# Altium schematic symbol library TI - ADC.SchLib: 2197 symbols (part 7 of 130) (continued)
## ADS42B49IRGCT (continued)

## ADS42JB49IRGCR
designator U?
Dual 14-Bit, 250 MSPS ADC, -40 to 85 degC, 64-pin QFN (RGC64), Green (RoHS & no Sb/Br); Manufacturer: Texas Instruments; PartNumber: ADS42JB49IRGCR; # Input Channels: 2; Analog Voltage AV/DD(Max)(V): 3.45; Analog Voltage AV/DD(Min)(V): 3.15; Architecture: Pipeline; Digital Supply(Max)(V): 1.9; Digital Supply(Min)(V): 1.7; Interface: JEDEC 204B; Resolution(Bits): 14; Sample Rate(max)(SPS): 250M; SFDR(dB): 89; SNR(dB): 71.9; SubFamily: High Speed ADC (>10MSPS); DatasheetVersion: SLAS900A; PackageVersion: 4204106/F, 11/2011; PackageReference: RGC64-7400X7400TP; PackageDescription: 64-Pin Plastic Quad Flatpack No-Lead, Body 9 x 9 mm, Pitch 0.5 mm; Supplier 1: Digi-Key; Supplier Part Number 1: ADS1110A1IDBVR-ND; Supplier 2: Mouser; Supplier Part Number 2: 595-ADS1110A1IDBVR; Mounting Technology: Surface Mount; ComponentLink1Description: Manufacturer URL; ComponentLink1URL: http://www.ti.com/; ComponentLink2Description: Datasheet; ComponentLink2URL: http://www.ti.com/lit/ds/symlink/ads42jb49.pdf; ComponentLink3Description: Package Specification; ComponentLink3URL: http://www.ti.com/litv/pdf/mpqf125e
footprint TI-RGC64-7400X7400TP_V (QFN, 64-Leads, Body 9x9mm, Pitch 0.5mm, Thermal Pad 7.4x7.4mm, TI Recommended)
part A pins: 13 INBP (in) "Differential analog input for channel B", 14 INBM (in) "Differential analog input for channel B", 35 INAM (in) "Differential analog input for channel A", 36 INAP (in) "Differential analog input for channel A", 51 DA1M (out) "JESD204B Serial data output for channel A", 52 DA1P (out) "JESD204B Serial data output for channel A", 53 DA0M (out) "JESD204B Serial data output for channel A", 54 DA0P (out) "JESD204B Serial data output for channel A", 56 DB0P (out) "JESD204B Serial data output for channel B", 57 DB0M (out) "JESD204B Serial data output for channel B", 58 DB1P (out) "JESD204B Serial data output for channel B", 59 DB1M (out) "JESD204B Serial data output for channel B", 61 OVRA (out) "Overrange indication channel A", 62 OVRB (out) "Overrange indication channel B"
part B pins: 4 MODE (in) "Connect to GND", 5 STBY (in) "Standby. Active high with internal pulldown resistor", 6 PDN_GBL (in) "Global power down. Active high with internal pulldown resistor", 8 SYNCP (in) "Synchronization input for JESD204B port", 9 SYNCM (in) "Synchronization input for JESD204B port", 10 CTRL2 (in) "Power down control", 21 VCM (out) "Common mode voltage for analog inputs, 1.9V", 24 CLKINM (in) "Differential clock input for ADC", 25 CLKINP (in) "Differential clock input for ADC", 29 SYSREFP (in) "External sync input", 30 SYSREFM (in) "External sync input", 39 CTRL1 (in) "Power down control", 41 SEN (in) "Serial interface enable", 42 SDATA (in) "Serial interface data input.", 43 SCLK (in) "Serial interface clock input", 44 RESET (in) "Hardware reset. Active high. This pin has an internal 150kO pull-down resistor.", 45 SDOUT (hiz) "Serial interface data output"
part C pins: 1 DGND (power) "Digital ground", 2 DRVDD (power) "Digital 1.8V power supply", 3 DGND (power) "Digital ground", 7 DRVDD (power) "Digital 1.8V power supply", 11 AVDD (power) "Analog 1.8V power supply", 12 AGND (power) "Analog ground", 15 AGND (power) "Analog ground", 16 AVDD (power) "Analog 1.8V power supply", 17 AVDD3V (power) "Analog 3.3V for analog buffer", 18 AVDD (power) "Analog 1.8V power supply", 19 AGND (power) "Analog ground", 20 AGND (power) "Analog ground", 22 AVDD (power) "Analog 1.8V power supply", 23 AGND (power) "Analog ground", 26 AGND (power) "Analog ground", 27 AVDD (power) "Analog 1.8V power supply", 28 AGND (power) "Analog ground", 31 AVDD (power) "Analog 1.8V power supply", 32 AVDD3V (power) "Analog 3.3V for analog buffer", 33 AVDD (power) "Analog 1.8V power supply", 34 AGND (power) "Analog ground", 37 AGND (power) "Analog ground", 38 AVDD (power) "Analog 1.8V power supply", 40 AVDD (power) "Analog 1.8V power supply", 46 DGND (power) "Digital ground", 47 DRVDD (power) "Digital 1.8V power supply", 48 DGND (power) "Digital ground", 49 DRVDD (power) "Digital 1.8V power supply", 50 DGND (power) "Digital ground", 55 IOVDD (power) "Digital 1.8V power supply for the JESD204B transmitter", 60 DRVDD (power) "Digital 1.8V power supply", 63 DGND (power) "Digital ground", 64 DRVDD (power) "Digital 1.8V power supply", 65 EP (power)

## ADS42JB49IRGCT
designator U?
Dual 14-Bit, 250 MSPS ADC, -40 to 85 degC, 64-pin QFN (RGC64), Green (RoHS & no Sb/Br); Manufacturer: Texas Instruments; PartNumber: ADS42JB49IRGCT; # Input Channels: 2; Analog Voltage AV/DD(Max)(V): 3.45; Analog Voltage AV/DD(Min)(V): 3.15; Architecture: Pipeline; Digital Supply(Max)(V): 1.9; Digital Supply(Min)(V): 1.7; Interface: JEDEC 204B; Resolution(Bits): 14; Sample Rate(max)(SPS): 250M; SFDR(dB): 89; SNR(dB): 71.9; SubFamily: High Speed ADC (>10MSPS); DatasheetVersion: SLAS900A; PackageVersion: 4204106/F, 11/2011; PackageReference: RGC64-7400X7400TP; PackageDescription: 64-Pin Plastic Quad Flatpack No-Lead, Body 9 x 9 mm, Pitch 0.5 mm; Supplier 1: Digi-Key; Supplier Part Number 1: ADS1110A1IDBVRG4-ND; Supplier 2: Mouser; Supplier Part Number 2: 595-ADS1110A1IDBVRG4; Mounting Technology: Surface Mount; ComponentLink1Description: Manufacturer URL; ComponentLink1URL: http://www.ti.com/; ComponentLink2Description: Datasheet; ComponentLink2URL: http://www.ti.com/lit/ds/symlink/ads42jb49.pdf; ComponentLink3Description: Package Specification; ComponentLink3URL: http://www.ti.com/litv/pdf/mpqf125e
footprint TI-RGC64-7400X7400TP_V (QFN, 64-Leads, Body 9x9mm, Pitch 0.5mm, Thermal Pad 7.4x7.4mm, TI Recommended)
part A pins: 13 INBP (in) "Differential analog input for channel B", 14 INBM (in) "Differential analog input for channel B", 35 INAM (in) "Differential analog input for channel A", 36 INAP (in) "Differential analog input for channel A", 51 DA1M (out) "JESD204B Serial data output for channel A", 52 DA1P (out) "JESD204B Serial data output for channel A", 53 DA0M (out) "JESD204B Serial data output for channel A", 54 DA0P (out) "JESD204B Serial data output for channel A", 56 DB0P (out) "JESD204B Serial data output for channel B", 57 DB0M (out) "JESD204B Serial data output for channel B", 58 DB1P (out) "JESD204B Serial data output for channel B", 59 DB1M (out) "JESD204B Serial data output for channel B", 61 OVRA (out) "Overrange indication channel A", 62 OVRB (out) "Overrange indication channel B"
part B pins: 4 MODE (in) "Connect to GND", 5 STBY (in) "Standby. Active high with internal pulldown resistor", 6 PDN_GBL (in) "Global power down. Active high with internal pulldown resistor", 8 SYNCP (in) "Synchronization input for JESD204B port", 9 SYNCM (in) "Synchronization input for JESD204B port", 10 CTRL2 (in) "Power down control", 21 VCM (out) "Common mode voltage for analog inputs, 1.9V", 24 CLKINM (in) "Differential clock input for ADC", 25 CLKINP (in) "Differential clock input for ADC", 29 SYSREFP (in) "External sync input", 30 SYSREFM (in) "External sync input", 39 CTRL1 (in) "Power down control", 41 SEN (in) "Serial interface enable", 42 SDATA (in) "Serial interface data input.", 43 SCLK (in) "Serial interface clock input", 44 RESET (in) "Hardware reset. Active high. This pin has an internal 150kO pull-down resistor.", 45 SDOUT (hiz) "Serial interface data output"
part C pins: 1 DGND (power) "Digital ground", 2 DRVDD (power) "Digital 1.8V power supply", 3 DGND (power) "Digital ground", 7 DRVDD (power) "Digital 1.8V power supply", 11 AVDD (power) "Analog 1.8V power supply", 12 AGND (power) "Analog ground", 15 AGND (power) "Analog ground", 16 AVDD (power) "Analog 1.8V power supply", 17 AVDD3V (power) "Analog 3.3V for analog buffer", 18 AVDD (power) "Analog 1.8V power supply", 19 AGND (power) "Analog ground", 20 AGND (power) "Analog ground", 22 AVDD (power) "Analog 1.8V power supply", 23 AGND (power) "Analog ground", 26 AGND (power) "Analog ground", 27 AVDD (power) "Analog 1.8V power supply", 28 AGND (power) "Analog ground", 31 AVDD (power) "Analog 1.8V power supply", 32 AVDD3V (power) "Analog 3.3V for analog buffer", 33 AVDD (power) "Analog 1.8V power supply", 34 AGND (power) "Analog ground", 37 AGND (power) "Analog ground", 38 AVDD (power) "Analog 1.8V power supply", 40 AVDD (power) "Analog 1.8V power supply", 46 DGND (power) "Digital ground", 47 DRVDD (power) "Digital 1.8V power supply", 48 DGND (power) "Digital ground", 49 DRVDD (power) "Digital 1.8V power supply", 50 DGND (power) "Digital ground", 55 IOVDD (power) "Digital 1.8V power supply for the JESD204B transmitter", 60 DRVDD (power) "Digital 1.8V power supply", 63 DGND (power) "Digital ground", 64 DRVDD (power) "Digital 1.8V power supply", 65 EP (power)

## ADS42JB69IRGC25
designator U?
Dual 16-Bit, 250 MSPS ADC, -40 to 85 degC, 64-pin QFN (RGC64), Green (RoHS & no Sb/Br); Manufacturer: Texas Instruments; PartNumber: ADS42JB69IRGC25; # Input Channels: 2; Analog Voltage AV/DD(Max)(V): 3.45; Analog Voltage AV/DD(Min)(V): 3.15; Architecture: Pipeline; Digital Supply(Max)(V): 1.9; Digital Supply(Min)(V): 1.7; Interface: JEDEC 204B; Resolution(Bits): 16; Sample Rate(max)(SPS): 250M; SFDR(dB): 89; SNR(dB): 73.3; SubFamily: High Speed ADC (>10MSPS); DatasheetVersion: SLAS900A; PackageVersion: 4204106/F, 11/2011; PackageReference: RGC64-7400X7400TP; PackageDescription: 64-Pin Plastic Quad Flatpack No-Lead, Body 9 x 9 mm, Pitch 0.5 mm; Supplier 1: Digi-Key; Supplier Part Number 1: 296-14462-2-ND; Supplier 2: Digi-Key; Supplier Part Number 2: 296-14462-1-ND; Supplier 3: Digi-Key; Supplier Part Number 3: 296-14462-6-ND; Supplier 4: Newark; Supplier Part Number 4: 61H4890; Supplier 5: Mouser; Supplier Part Number 5: 595-ADS1110A1IDBVT; Eco-Plan: Green (RoHS & no Sb/Br); Mounting Technology: Surface Mount; ComponentLink1Description: Manufacturer URL; ComponentLink1URL: http://www.ti.com/; ComponentLink2Description: Datasheet; ComponentLink2URL: http://www.ti.com/lit/ds/symlink/ads42jb69.pdf; ComponentLink3Description: Package Specification; ComponentLink3URL: http://www.ti.com/litv/pdf/mpqf125e
footprint TI-RGC64-7400X7400TP_V (QFN, 64-Leads, Body 9x9mm, Pitch 0.5mm, Thermal Pad 7.4x7.4mm, TI Recommended)
part A pins: 13 INBP (in) "Differential analog input for channel B", 14 INBM (in) "Differential analog input for channel B", 35 INAM (in) "Differential analog input for channel A", 36 INAP (in) "Differential analog input for channel A", 51 DA1M (out) "JESD204B Serial data output for channel A", 52 DA1P (out) "JESD204B Serial data output for channel A", 53 DA0M (out) "JESD204B Serial data output for channel A", 54 DA0P (out) "JESD204B Serial data output for channel A", 56 DB0P (out) "JESD204B Serial data output for channel B", 57 DB0M (out) "JESD204B Serial data output for channel B", 58 DB1P (out) "JESD204B Serial data output for channel B", 59 DB1M (out) "JESD204B Serial data output for channel B", 61 OVRA (out) "Overrange indication channel A", 62 OVRB (out) "Overrange indication channel B"
part B pins: 4 MODE (in) "Connect to GND", 5 STBY (in) "Standby. Active high with internal pulldown resistor", 6 PDN_GBL (in) "Global power down. Active high with internal pulldown resistor", 8 SYNCP (in) "Synchronization input for JESD204B port", 9 SYNCM (in) "Synchronization input for JESD204B port", 10 CTRL2 (in) "Power down control", 21 VCM (out) "Common mode voltage for analog inputs, 1.9V", 24 CLKINM (in) "Differential clock input for ADC", 25 CLKINP (in) "Differential clock input for ADC", 29 SYSREFP (in) "External sync input", 30 SYSREFM (in) "External sync input", 39 CTRL1 (in) "Power down control", 41 SEN (in) "Serial interface enable", 42 SDATA (in) "Serial interface data input.", 43 SCLK (in) "Serial interface clock input", 44 RESET (in) "Hardware reset. Active high. This pin has an internal 150kO pull-down resistor.", 45 SDOUT (hiz) "Serial interface data output"
part C pins: 1 DGND (power) "Digital ground", 2 DRVDD (power) "Digital 1.8V power supply", 3 DGND (power) "Digital ground", 7 DRVDD (power) "Digital 1.8V power supply", 11 AVDD (power) "Analog 1.8V power supply", 12 AGND (power) "Analog ground", 15 AGND (power) "Analog ground", 16 AVDD (power) "Analog 1.8V power supply", 17 AVDD3V (power) "Analog 3.3V for analog buffer", 18 AVDD (power) "Analog 1.8V power supply", 19 AGND (power) "Analog ground", 20 AGND (power) "Analog ground", 22 AVDD (power) "Analog 1.8V power supply", 23 AGND (power) "Analog ground", 26 AGND (power) "Analog ground", 27 AVDD (power) "Analog 1.8V power supply", 28 AGND (power) "Analog ground", 31 AVDD (power) "Analog 1.8V power supply", 32 AVDD3V (power) "Analog 3.3V for analog buffer", 33 AVDD (power) "Analog 1.8V power supply", 34 AGND (power) "Analog ground", 37 AGND (power) "Analog ground", 38 AVDD (power) "Analog 1.8V power supply", 40 AVDD (power) "Analog 1.8V power supply", 46 DGND (power) "Digital ground", 47 DRVDD (power) "Digital 1.8V power supply", 48 DGND (power) "Digital ground", 49 DRVDD (power) "Digital 1.8V power supply", 50 DGND (power) "Digital ground", 55 IOVDD (power) "Digital 1.8V power supply for the JESD204B transmitter", 60 DRVDD (power) "Digital 1.8V power supply", 63 DGND (power) "Digital ground", 64 DRVDD (power) "Digital 1.8V power supply", 65 EP (power)

## ADS42JB69IRGCR
designator U?
Dual 16-Bit, 250 MSPS ADC, -40 to 85 degC, 64-pin QFN (RGC64), Green (RoHS & no Sb/Br); Manufacturer: Texas Instruments; PartNumber: ADS42JB69IRGCR; # Input Channels: 2; Analog Voltage AV/DD(Max)(V): 3.45; Analog Voltage AV/DD(Min)(V): 3.15; Architecture: Pipeline; Digital Supply(Max)(V): 1.9; Digital Supply(Min)(V): 1.7; Interface: JEDEC 204B; Resolution(Bits): 16; Sample Rate(max)(SPS): 250M; SFDR(dB): 89; SNR(dB): 73.3; SubFamily: High Speed ADC (>10MSPS); DatasheetVersion: SLAS900A; PackageVersion: 4204106/F, 11/2011; PackageReference: RGC64-7400X7400TP; PackageDescription: 64-Pin Plastic Quad Flatpack No-Lead, Body 9 x 9 mm, Pitch 0.5 mm; Supplier 1: Digi-Key; Supplier Part Number 1: ADS1110A1IDBVTG4-ND; Supplier 2: Mouser; Supplier Part Number 2: 595-ADS1110A1IDBVTG4; Eco-Plan: Green (RoHS & no Sb/Br); Mounting Technology: Surface Mount; ComponentLink1Description: Manufacturer URL; ComponentLink1URL: http://www.ti.com/; ComponentLink2Description: Datasheet; ComponentLink2URL: http://www.ti.com/lit/ds/symlink/ads42jb69.pdf; ComponentLink3Description: Package Specification; ComponentLink3URL: http://www.ti.com/litv/pdf/mpqf125e
footprint TI-RGC64-7400X7400TP_V (QFN, 64-Leads, Body 9x9mm, Pitch 0.5mm, Thermal Pad 7.4x7.4mm, TI Recommended)
part A pins: 13 INBP (in) "Differential analog input for channel B", 14 INBM (in) "Differential analog input for channel B", 35 INAM (in) "Differential analog input for channel A", 36 INAP (in) "Differential analog input for channel A", 51 DA1M (out) "JESD204B Serial data output for channel A", 52 DA1P (out) "JESD204B Serial data output for channel A", 53 DA0M (out) "JESD204B Serial data output for channel A", 54 DA0P (out) "JESD204B Serial data output for channel A", 56 DB0P (out) "JESD204B Serial data output for channel B", 57 DB0M (out) "JESD204B Serial data output for channel B", 58 DB1P (out) "JESD204B Serial data output for channel B", 59 DB1M (out) "JESD204B Serial data output for channel B", 61 OVRA (out) "Overrange indication channel A", 62 OVRB (out) "Overrange indication channel B"
part B pins: 4 MODE (in) "Connect to GND", 5 STBY (in) "Standby. Active high with internal pulldown resistor", 6 PDN_GBL (in) "Global power down. Active high with internal pulldown resistor", 8 SYNCP (in) "Synchronization input for JESD204B port", 9 SYNCM (in) "Synchronization input for JESD204B port", 10 CTRL2 (in) "Power down control", 21 VCM (out) "Common mode voltage for analog inputs, 1.9V", 24 CLKINM (in) "Differential clock input for ADC", 25 CLKINP (in) "Differential clock input for ADC", 29 SYSREFP (in) "External sync input", 30 SYSREFM (in) "External sync input", 39 CTRL1 (in) "Power down control", 41 SEN (in) "Serial interface enable", 42 SDATA (in) "Serial interface data input.", 43 SCLK (in) "Serial interface clock input", 44 RESET (in) "Hardware reset. Active high. This pin has an internal 150kO pull-down resistor.", 45 SDOUT (hiz) "Serial interface data output"
part C pins: 1 DGND (power) "Digital ground", 2 DRVDD (power) "Digital 1.8V power supply", 3 DGND (power) "Digital ground", 7 DRVDD (power) "Digital 1.8V power supply", 11 AVDD (power) "Analog 1.8V power supply", 12 AGND (power) "Analog ground", 15 AGND (power) "Analog ground", 16 AVDD (power) "Analog 1.8V power supply", 17 AVDD3V (power) "Analog 3.3V for analog buffer", 18 AVDD (power) "Analog 1.8V power supply", 19 AGND (power) "Analog ground", 20 AGND (power) "Analog ground", 22 AVDD (power) "Analog 1.8V power supply", 23 AGND (power) "Analog ground", 26 AGND (power) "Analog ground", 27 AVDD (power) "Analog 1.8V power supply", 28 AGND (power) "Analog ground", 31 AVDD (power) "Analog 1.8V power supply", 32 AVDD3V (power) "Analog 3.3V for analog buffer", 33 AVDD (power) "Analog 1.8V power supply", 34 AGND (power) "Analog ground", 37 AGND (power) "Analog ground", 38 AVDD (power) "Analog 1.8V power supply", 40 AVDD (power) "Analog 1.8V power supply", 46 DGND (power) "Digital ground", 47 DRVDD (power) "Digital 1.8V power supply", 48 DGND (power) "Digital ground", 49 DRVDD (power) "Digital 1.8V power supply", 50 DGND (power) "Digital ground", 55 IOVDD (power) "Digital 1.8V power supply for the JESD204B transmitter", 60 DRVDD (power) "Digital 1.8V power supply", 63 DGND (power) "Digital ground", 64 DRVDD (power) "Digital 1.8V power supply", 65 EP (power)

## ADS42JB69IRGCT
designator U?
Dual 16-Bit, 250 MSPS ADC, -40 to 85 degC, 64-pin QFN (RGC64), Green (RoHS & no Sb/Br); Manufacturer: Texas Instruments; PartNumber: ADS42JB69IRGCT; # Input Channels: 2; Analog Voltage AV/DD(Max)(V): 3.45; Analog Voltage AV/DD(Min)(V): 3.15; Architecture: Pipeline; Digital Supply(Max)(V): 1.9; Digital Supply(Min)(V): 1.7; Interface: JEDEC 204B; Resolution(Bits): 16; Sample Rate(max)(SPS): 250M; SFDR(dB): 89; SNR(dB): 73.3; SubFamily: High Speed ADC (>10MSPS); DatasheetVersion: SLAS900A; PackageVersion: 4204106/F, 11/2011; PackageReference: RGC64-7400X7400TP; PackageDescription: 64-Pin Plastic Quad Flatpack No-Lead, Body 9 x 9 mm, Pitch 0.5 mm; Supplier 1: Digi-Key; Supplier Part Number 1: ADS1110A2IDBVR-ND; Supplier 2: Mouser; Supplier Part Number 2: 595-ADS1110A2IDBVR; Eco-Plan: Green (RoHS & no Sb/Br); Mounting Technology: Surface Mount; ComponentLink1Description: Manufacturer URL; ComponentLink1URL: http://www.ti.com/; ComponentLink2Description: Datasheet; ComponentLink2URL: http://www.ti.com/lit/ds/symlink/ads42jb69.pdf; ComponentLink3Description: Package Specification; ComponentLink3URL: http://www.ti.com/litv/pdf/mpqf125e
footprint TI-RGC64-7400X7400TP_V (QFN, 64-Leads, Body 9x9mm, Pitch 0.5mm, Thermal Pad 7.4x7.4mm, TI Recommended)
part A pins: 13 INBP (in) "Differential analog input for channel B", 14 INBM (in) "Differential analog input for channel B", 35 INAM (in) "Differential analog input for channel A", 36 INAP (in) "Differential analog input for channel A", 51 DA1M (out) "JESD204B Serial data output for channel A", 52 DA1P (out) "JESD204B Serial data output for channel A", 53 DA0M (out) "JESD204B Serial data output for channel A", 54 DA0P (out) "JESD204B Serial data output for channel A", 56 DB0P (out) "JESD204B Serial data output for channel B", 57 DB0M (out) "JESD204B Serial data output for channel B", 58 DB1P (out) "JESD204B Serial data output for channel B", 59 DB1M (out) "JESD204B Serial data output for channel B", 61 OVRA (out) "Overrange indication channel A", 62 OVRB (out) "Overrange indication channel B"
part B pins: 4 MODE (in) "Connect to GND", 5 STBY (in) "Standby. Active high with internal pulldown resistor", 6 PDN_GBL (in) "Global power down. Active high with internal pulldown resistor", 8 SYNCP (in) "Synchronization input for JESD204B port", 9 SYNCM (in) "Synchronization input for JESD204B port", 10 CTRL2 (in) "Power down control", 21 VCM (out) "Common mode voltage for analog inputs, 1.9V", 24 CLKINM (in) "Differential clock input for ADC", 25 CLKINP (in) "Differential clock input for ADC", 29 SYSREFP (in) "External sync input", 30 SYSREFM (in) "External sync input", 39 CTRL1 (in) "Power down control", 41 SEN (in) "Serial interface enable", 42 SDATA (in) "Serial interface data input.", 43 SCLK (in) "Serial interface clock input", 44 RESET (in) "Hardware reset. Active high. This pin has an internal 150kO pull-down resistor.", 45 SDOUT (hiz) "Serial interface data output"
part C pins: 1 DGND (power) "Digital ground", 2 DRVDD (power) "Digital 1.8V power supply", 3 DGND (power) "Digital ground", 7 DRVDD (power) "Digital 1.8V power supply", 11 AVDD (power) "Analog 1.8V power supply", 12 AGND (power) "Analog ground", 15 AGND (power) "Analog ground", 16 AVDD (power) "Analog 1.8V power supply", 17 AVDD3V (power) "Analog 3.3V for analog buffer", 18 AVDD (power) "Analog 1.8V power supply", 19 AGND (power) "Analog ground", 20 AGND (power) "Analog ground", 22 AVDD (power) "Analog 1.8V power supply", 23 AGND (power) "Analog ground", 26 AGND (power) "Analog ground", 27 AVDD (power) "Analog 1.8V power supply", 28 AGND (power) "Analog ground", 31 AVDD (power) "Analog 1.8V power supply", 32 AVDD3V (power) "Analog 3.3V for analog buffer", 33 AVDD (power) "Analog 1.8V power supply", 34 AGND (power) "Analog ground", 37 AGND (power) "Analog ground", 38 AVDD (power) "Analog 1.8V power supply", 40 AVDD (power) "Analog 1.8V power supply", 46 DGND (power) "Digital ground", 47 DRVDD (power) "Digital 1.8V power supply", 48 DGND (power) "Digital ground", 49 DRVDD (power) "Digital 1.8V power supply", 50 DGND (power) "Digital ground", 55 IOVDD (power) "Digital 1.8V power supply for the JESD204B transmitter", 60 DRVDD (power) "Digital 1.8V power supply", 63 DGND (power) "Digital ground", 64 DRVDD (power) "Digital 1.8V power supply", 65 EP (power)

## ADS42LB49IRGCR
designator U?
Dual 14-Bit, 250 MSPS ADC, -40 to 85 degC, 64-pin QFN (RGC64); Manufacturer: Texas Instruments; PartNumber: ADS42LB49IRGCR; # Input Channels: 2; Analog Voltage AV/DD(Max)(V): 3.45; Analog Voltage AV/DD(Min)(V): 3.15; Architecture: Pipeline; Digital Supply(Max)(V): 1.9; Digital Supply(Min)(V): 1.7; Interface: Parallel LVDS; Resolution(Bits): 14; Sample Rate(max)(SPS): 250M; SFDR(dB): 89; SNR(dB): 71.9; SubFamily: High Speed ADC (>10MSPS); DatasheetVersion: SLAS904B; PackageVersion: 4204106/F, 11/2011; PackageReference: RGC64-7400X7400TP; PackageDescription: 64-Pin Plastic Quad Flatpack No-Lead, Body 9 x 9 mm, Pitch 0.5 mm; Supplier 1: Digi-Key; Supplier Part Number 1: ADS1110A2IDBVRG4-ND; Supplier 2: Mouser; Supplier Part Number 2: 595-ADS1110A2IDBVRG4; Mounting Technology: Surface Mount; ComponentLink1Description: Manufacturer URL; ComponentLink1URL: http://www.ti.com/; ComponentLink2Description: Datasheet; ComponentLink2URL: http://www.ti.com/lit/ds/symlink/ads42lb49.pdf; ComponentLink3Description: Package Specification; ComponentLink3URL: http://www.ti.com/litv/pdf/mpqf125e
footprint TI-RGC64-7400X7400TP_V (QFN, 64-Leads, Body 9x9mm, Pitch 0.5mm, Thermal Pad 7.4x7.4mm, TI Recommended)
part A pins: 1 DB6M/DB1M (out), 2 DB6P/DB1P (out), 3 DB4M/DBCLKM (out), 4 DB4P/DBCLKP (out), 5 DB2M/DB2M (out), 6 DB2P/DB2P (out), 7 DB0M/DB3M (out), 8 DB0P/DB3P (out), 14 INBP (in) "Differential analog input for channel B", 15 INBM (in) "Differential analog input for channel B", 34 INAM (in) "Differential analog input for channel A", 35 INAP (in) "Differential analog input for channel A", 41 DA0M (out), 42 DA0P (out), 43 DA2M/DA1M (out), 44 DA2P/DA1P (out), 45 DA4M/DACLKM (out), 46 DA4P/DACLKP (out), 47 DA6M/DA2M (out), 48 DA6P/DA2P (out), 50 DA8M/DA3M (out), 51 DA8P/DA3P (out), 52 DA10M/DAFRAMEM (out), 53 DA10P/DAFRAMEP (out), 54 DA12M/OVRA (out), 55 DA12P/NC (out), 58 DB12M/NC (out), 59 DB12P/OVRB (out), 60 DB10M/NC (out), 61 DB10P/NC (out), 62 DB8M/DB0M (out), 63 DB8P/DB0P (out)
part B pins: 9 NC/DBFRAMEM (out), 10 NC/DBFRAMEP (out), 12 CTRL2 (io) "Can be configured as power-down input pin or as OVR output pin for channel B, depending on the register bit PDN/OVR FOR CTRL PINS.", 18 SCLK (in) "Serial interface clock input", 19 SDATA (in) "Serial interface data input.", 20 SEN (in) "Serial interface enable", 21 SDOUT (hiz) "Serial interface data output", 22 RESET (in) "Hardware reset. Active high. This pin has an internal 150kohm pull-down resistor.", 24 CLKINM (in) "Differential clock input for ADC", 25 CLKINP (in) "Differential clock input for ADC", 27 VCM (out) "Common-mode voltage for analog inputs, 1.85 V", 28 RESERVED "Do not connect", 29 SYNCINP (in) "External sync input. If not used, SYNCINP should be connected to GND and SYNCINM connected to AVDD.", 30 SYNCINM (in) "External sync input. If not used, SYNCINP should be connected to GND and SYNCINM connected to AVDD.", 37 CTRL1 (io) "Can be configured as power-down input pin or as OVR output pin for channel A, depending on the register bit PDN/OVR FOR CTRL PINS.", 39 NC "Do not connect", 40 NC "Do not connect", 56 CLKOUTM/NC (out), 57 CLKOUTP/NC (out)
part C pins: 11 DRVDD (power) "Digital 1.8-V power supply", 13 AVDD (power) "Analog 1.8-V power supply", 16 AVDD (power) "Analog 1.8-V power supply", 17 AVDD3V (power) "Analog 3.3 V power supply for analog buffer", 23 AVDD (power) "Analog 1.8-V power supply", 26 AVDD (power) "Analog 1.8-V power supply", 31 AVDD (power) "Analog 1.8-V power supply", 32 AVDD3V (power) "Analog 3.3 V power supply for analog buffer", 33 AVDD (power) "Analog 1.8-V power supply", 36 AVDD (power) "Analog 1.8-V power supply", 38 AVDD (power) "Analog 1.8-V power supply", 49 DRVDD (power) "Digital 1.8-V power supply", 64 DRVDD (power) "Digital 1.8-V power supply", 65 EP (power) "Ground"

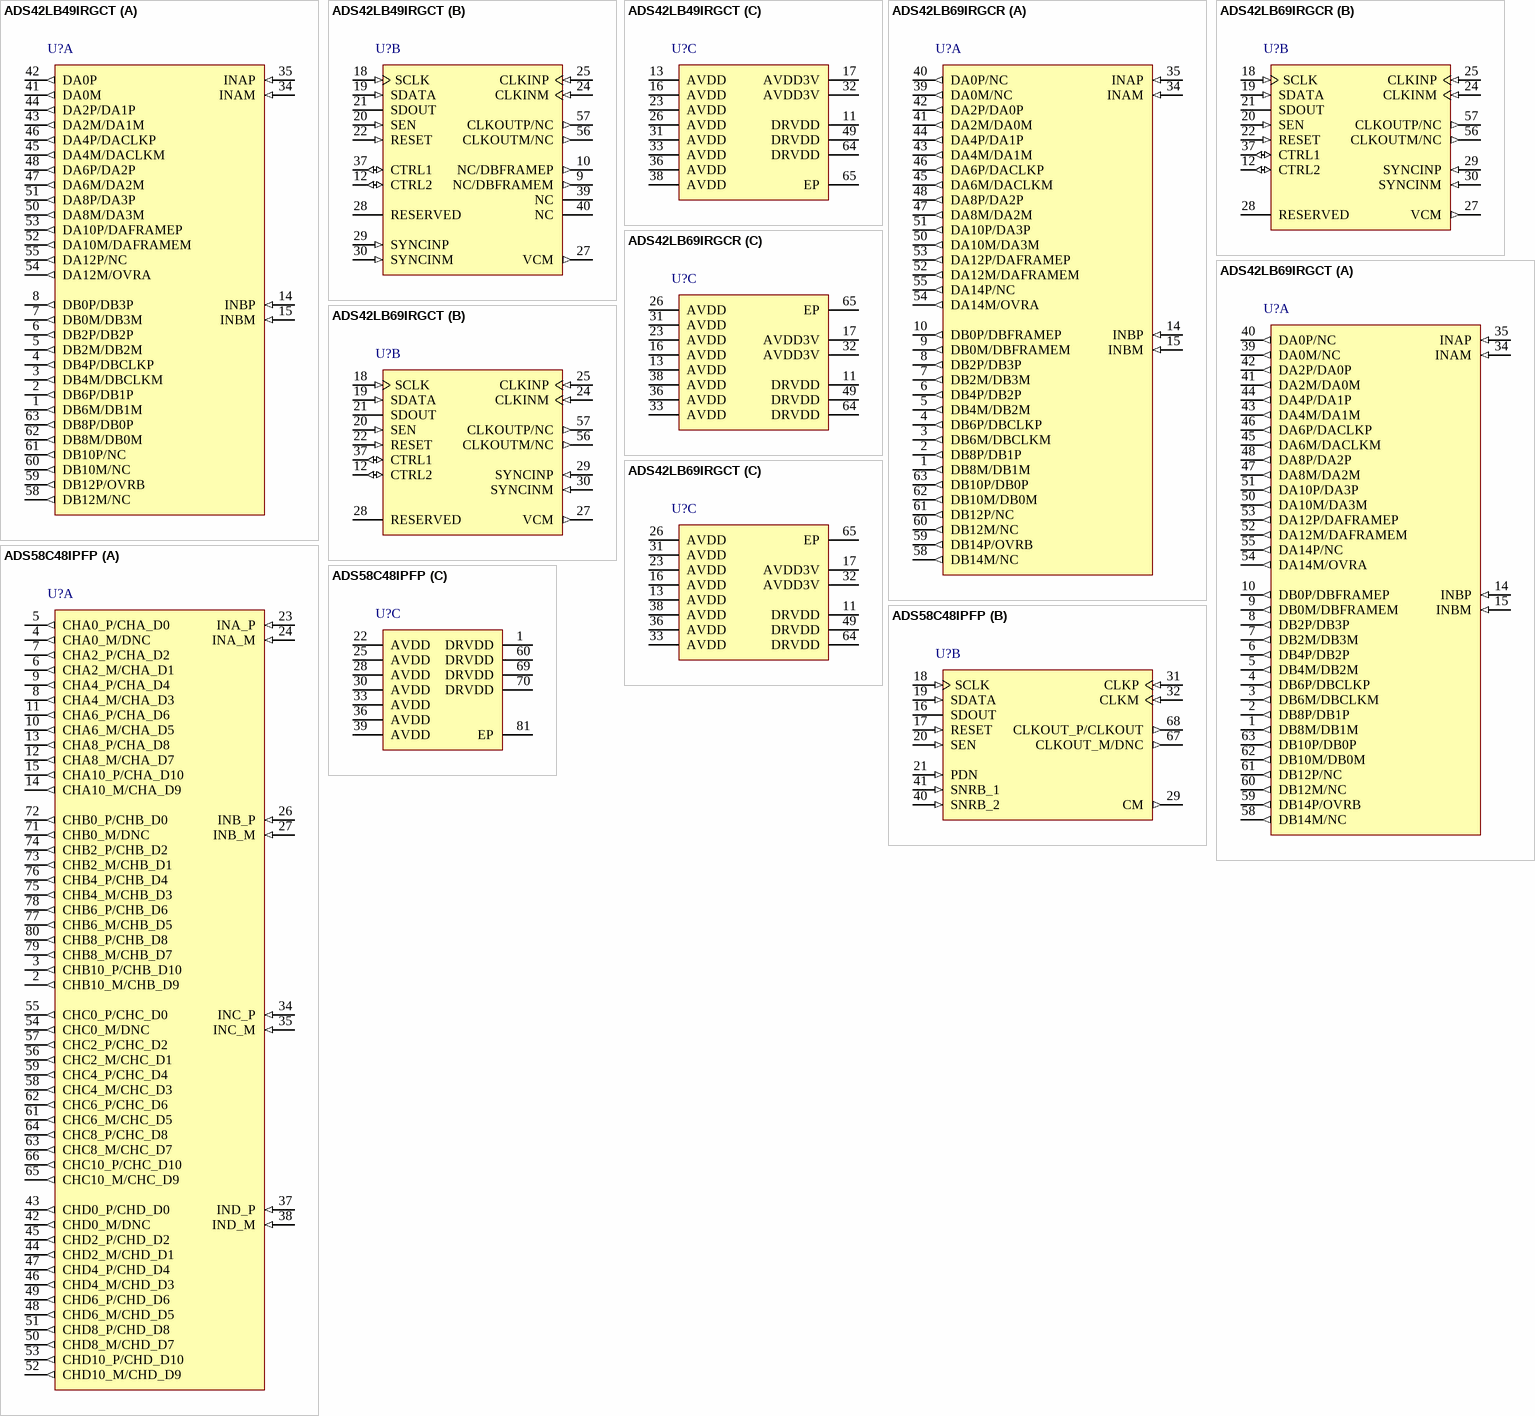
[diagram p4: symbols ADS42LB49IRGCT to ADS58C48IPFP]

## ADS42LB49IRGCT
designator U?
Dual 14-Bit, 250 MSPS ADC, -40 to 85 degC, 64-pin QFN (RGC64); Manufacturer: Texas Instruments; PartNumber: ADS42LB49IRGCT; # Input Channels: 2; Analog Voltage AV/DD(Max)(V): 3.45; Analog Voltage AV/DD(Min)(V): 3.15; Architecture: Pipeline; Digital Supply(Max)(V): 1.9; Digital Supply(Min)(V): 1.7; Interface: Parallel LVDS; Resolution(Bits): 14; Sample Rate(max)(SPS): 250M; SFDR(dB): 89; SNR(dB): 71.9; SubFamily: High Speed ADC (>10MSPS); DatasheetVersion: SLAS904B; PackageVersion: 4204106/F, 11/2011; PackageReference: RGC64-7400X7400TP; PackageDescription: 64-Pin Plastic Quad Flatpack No-Lead, Body 9 x 9 mm, Pitch 0.5 mm; Supplier 1: Digi-Key; Supplier Part Number 1: 296-14463-2-ND; Supplier 2: Digi-Key; Supplier Part Number 2: 296-14463-1-ND; Supplier 3: Digi-Key; Supplier Part Number 3: 296-14463-6-ND; Supplier 4: Farnell; Supplier Part Number 4: 8408882; Supplier 5: Mouser; Supplier Part Number 5: 595-ADS1110A2IDBVT; Mounting Technology: Surface Mount; ComponentLink1Description: Manufacturer URL; ComponentLink1URL: http://www.ti.com/; ComponentLink2Description: Datasheet; ComponentLink2URL: http://www.ti.com/lit/ds/symlink/ads42lb49.pdf; ComponentLink3Description: Package Specification; ComponentLink3URL: http://www.ti.com/litv/pdf/mpqf125e
footprint TI-RGC64-7400X7400TP_V (QFN, 64-Leads, Body 9x9mm, Pitch 0.5mm, Thermal Pad 7.4x7.4mm, TI Recommended)
part A pins: 1 DB6M/DB1M (out), 2 DB6P/DB1P (out), 3 DB4M/DBCLKM (out), 4 DB4P/DBCLKP (out), 5 DB2M/DB2M (out), 6 DB2P/DB2P (out), 7 DB0M/DB3M (out), 8 DB0P/DB3P (out), 14 INBP (in) "Differential analog input for channel B", 15 INBM (in) "Differential analog input for channel B", 34 INAM (in) "Differential analog input for channel A", 35 INAP (in) "Differential analog input for channel A", 41 DA0M (out), 42 DA0P (out), 43 DA2M/DA1M (out), 44 DA2P/DA1P (out), 45 DA4M/DACLKM (out), 46 DA4P/DACLKP (out), 47 DA6M/DA2M (out), 48 DA6P/DA2P (out), 50 DA8M/DA3M (out), 51 DA8P/DA3P (out), 52 DA10M/DAFRAMEM (out), 53 DA10P/DAFRAMEP (out), 54 DA12M/OVRA (out), 55 DA12P/NC (out), 58 DB12M/NC (out), 59 DB12P/OVRB (out), 60 DB10M/NC (out), 61 DB10P/NC (out), 62 DB8M/DB0M (out), 63 DB8P/DB0P (out)
part B pins: 9 NC/DBFRAMEM (out), 10 NC/DBFRAMEP (out), 12 CTRL2 (io) "Can be configured as power-down input pin or as OVR output pin for channel B, depending on the register bit PDN/OVR FOR CTRL PINS.", 18 SCLK (in) "Serial interface clock input", 19 SDATA (in) "Serial interface data input.", 20 SEN (in) "Serial interface enable", 21 SDOUT (hiz) "Serial interface data output", 22 RESET (in) "Hardware reset. Active high. This pin has an internal 150kohm pull-down resistor.", 24 CLKINM (in) "Differential clock input for ADC", 25 CLKINP (in) "Differential clock input for ADC", 27 VCM (out) "Common-mode voltage for analog inputs, 1.85 V", 28 RESERVED "Do not connect", 29 SYNCINP (in) "External sync input. If not used, SYNCINP should be connected to GND and SYNCINM connected to AVDD.", 30 SYNCINM (in) "External sync input. If not used, SYNCINP should be connected to GND and SYNCINM connected to AVDD.", 37 CTRL1 (io) "Can be configured as power-down input pin or as OVR output pin for channel A, depending on the register bit PDN/OVR FOR CTRL PINS.", 39 NC "Do not connect", 40 NC "Do not connect", 56 CLKOUTM/NC (out), 57 CLKOUTP/NC (out)
part C pins: 11 DRVDD (power) "Digital 1.8-V power supply", 13 AVDD (power) "Analog 1.8-V power supply", 16 AVDD (power) "Analog 1.8-V power supply", 17 AVDD3V (power) "Analog 3.3 V power supply for analog buffer", 23 AVDD (power) "Analog 1.8-V power supply", 26 AVDD (power) "Analog 1.8-V power supply", 31 AVDD (power) "Analog 1.8-V power supply", 32 AVDD3V (power) "Analog 3.3 V power supply for analog buffer", 33 AVDD (power) "Analog 1.8-V power supply", 36 AVDD (power) "Analog 1.8-V power supply", 38 AVDD (power) "Analog 1.8-V power supply", 49 DRVDD (power) "Digital 1.8-V power supply", 64 DRVDD (power) "Digital 1.8-V power supply", 65 EP (power) "Ground"

## ADS42LB69IRGCR
designator U?
Dual 16-Bit, 250 MSPS ADC, -40 to 85 degC, 64-pin QFN (RGC64); Manufacturer: Texas Instruments; PartNumber: ADS42LB69IRGCR; # Input Channels: 2; Analog Voltage AV/DD(Max)(V): 3.45; Analog Voltage AV/DD(Min)(V): 3.15; Architecture: Pipeline; Digital Supply(Max)(V): 1.9; Digital Supply(Min)(V): 1.7; Interface: Parallel LVDS; Resolution(Bits): 16; Sample Rate(max)(SPS): 250M; SFDR(dB): 89; SNR(dB): 73.3; SubFamily: High Speed ADC (>10MSPS); DatasheetVersion: SLAS904B; PackageVersion: 4204106/F, 11/2011; PackageReference: RGC64-7400X7400TP; PackageDescription: 64-Pin Plastic Quad Flatpack No-Lead, Body 9 x 9 mm, Pitch 0.5 mm; Supplier 1: Digi-Key; Supplier Part Number 1: ADS1110A2IDBVTG4-ND; Supplier 2: Mouser; Supplier Part Number 2: 595-ADS1110A2IDBVTG4; Mounting Technology: Surface Mount; ComponentLink1Description: Manufacturer URL; ComponentLink1URL: http://www.ti.com/; ComponentLink2Description: Datasheet; ComponentLink2URL: http://www.ti.com/lit/ds/symlink/ads42lb69.pdf; ComponentLink3Description: Package Specification; ComponentLink3URL: http://www.ti.com/litv/pdf/mpqf125e
footprint TI-RGC64-7400X7400TP_V (QFN, 64-Leads, Body 9x9mm, Pitch 0.5mm, Thermal Pad 7.4x7.4mm, TI Recommended)
part A pins: 1 DB8M/DB1M (out), 2 DB8P/DB1P (out), 3 DB6M/DBCLKM (out), 4 DB6P/DBCLKP (out), 5 DB4M/DB2M (out), 6 DB4P/DB2P (out), 7 DB2M/DB3M (out), 8 DB2P/DB3P (out), 9 DB0M/DBFRAMEM (out), 10 DB0P/DBFRAMEP (out), 14 INBP (in) "Differential analog input for channel B", 15 INBM (in) "Differential analog input for channel B", 34 INAM (in) "Differential analog input for channel A", 35 INAP (in) "Differential analog input for channel A", 39 DA0M/NC (out), 40 DA0P/NC (out), 41 DA2M/DA0M (out), 42 DA2P/DA0P (out), 43 DA4M/DA1M (out), 44 DA4P/DA1P (out), 45 DA6M/DACLKM (out), 46 DA6P/DACLKP (out), 47 DA8M/DA2M (out), 48 DA8P/DA2P (out), 50 DA10M/DA3M (out), 51 DA10P/DA3P (out), 52 DA12M/DAFRAMEM (out), 53 DA12P/DAFRAMEP (out), 54 DA14M/OVRA (out), 55 DA14P/NC (out), 58 DB14M/NC (out), 59 DB14P/OVRB (out), 60 DB12M/NC (out), 61 DB12P/NC (out), 62 DB10M/DB0M (out), 63 DB10P/DB0P (out)
part B pins: 12 CTRL2 (io) "Can be configured as power-down input pin or as OVR output pin for channel B, depending on the register bit PDN/OVR FOR CTRL PINS", 18 SCLK (in) "Serial interface clock input", 19 SDATA (in) "Serial interface data input.", 20 SEN (in) "Serial interface enable.", 21 SDOUT (hiz) "Serial interface data output", 22 RESET (in) "Hardware reset. Active high. This pin has an internal 150kohm pull-down resistor.", 24 CLKINM (in) "Differential clock input for ADC", 25 CLKINP (in) "Differential clock input for ADC", 27 VCM (out) "Common-mode voltage for analog inputs, 1.85 V", 28 RESERVED "Do not connect", 29 SYNCINP (in) "External sync input. If not used, SYNCINP should be connected to GND and SYNCINM connected to AVDD.", 30 SYNCINM (in) "External sync input. If not used, SYNCINP should be connected to GND and SYNCINM connected to AVDD.", 37 CTRL1 (io) "Can be configured as power-down input pin or as OVR output pin for channel A, depending on the register bit PDN/OVR FOR CTRL PINS.", 56 CLKOUTM/NC (out), 57 CLKOUTP/NC (out)
part C pins: 11 DRVDD (power) "Digital 1.8-V power supply", 13 AVDD (power) "Analog 1.8-V power supply", 16 AVDD (power) "Analog 1.8-V power supply", 17 AVDD3V (power) "Analog 3.3 V power supply for analog buffer", 23 AVDD (power) "Analog 1.8-V power supply", 26 AVDD (power) "Analog 1.8-V power supply", 31 AVDD (power) "Analog 1.8-V power supply", 32 AVDD3V (power) "Analog 3.3 V power supply for analog buffer", 33 AVDD (power) "Analog 1.8-V power supply", 36 AVDD (power) "Analog 1.8-V power supply", 38 AVDD (power) "Analog 1.8-V power supply", 49 DRVDD (power) "Digital 1.8-V power supply", 64 DRVDD (power) "Digital 1.8-V power supply", 65 EP (power) "Ground"